# Altium footprint library IC.PcbLib: 34 footprints (part 3 of 3)
Each footprint in its own frame and in the unit in brackets; x right, y up, seen from the top. Pads: shape width x height; smd on the part's side, far side on the other; paste and mask are expansions set on the pad; w line width, h text height; cw(c..) or ccw(c..) is an arc to the next point about the centre after c.
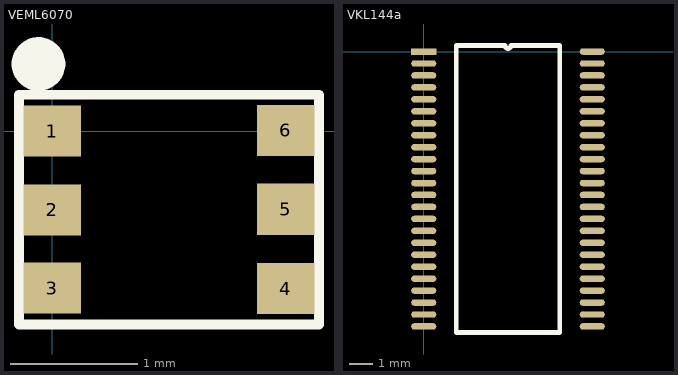
[diagram p2: the footprints below, top view; thin cyan lines are the x and y axes]

## VEML6070 [mm]
pads (6):
  rect 0.45x0.4 smd: 1(0,0) 2(0,-0.617) 3(0,-1.229) 4(1.829,-1.234) 5(1.829,-0.612) 6(1.829,0.005)
Top Overlay:
  circle w0.254: c-0.107,0.526 r0.083
  lines w0.076: -0.26,-1.516 2.09,-1.516 2.09,0.284 -0.26,0.284 -0.26,-1.516
3D body: height 0.25, standoff 0, extent -0.224,-1.506 2.062,0.272

## VKL144a [mm]
pads (48):
  rect 1.05x0.27 smd: 1(0,0)
  oval 1.05x0.27 smd: 2(0,-0.5) 3(0,-1) 4(0,-1.5) 5(0,-2) 6(0,-2.5) 7(0,-3) 8(0,-3.5) 9(0,-4) 10(0,-4.5) 11(0,-5) 12(0,-5.5) 13(0,-6) 14(0,-6.5) 15(0,-7) 16(0,-7.5) 17(0,-8) 18(0,-8.5) 19(0,-9) 20(0,-9.5) 21(0,-10) 22(0,-10.5) 23(0,-11) 24(0,-11.5) 25(7.05,-11.5) 26(7.05,-11) 27(7.05,-10.5) 28(7.05,-10) 29(7.05,-9.5) 30(7.05,-9) 31(7.05,-8.5) 32(7.05,-8) 33(7.05,-7.5) 34(7.05,-7) 35(7.05,-6.5) 36(7.05,-6) 37(7.05,-5.5) 38(7.05,-5) 39(7.05,-4.5) 40(7.05,-4) 41(7.05,-3.5) 42(7.05,-3) 43(7.05,-2.5) 44(7.05,-2) 45(7.05,-1.5) 46(7.05,-1) 47(7.05,-0.5) 48(7.05,0)
Top Overlay:
  lines w0.2: 1.36,-11.75 5.69,-11.75 5.69,0.25 3.65,0.25 cw(c3.525,0.25) 3.4,0.25 1.36,0.25 1.36,-11.75
3D body: height 2, standoff 0, extent 1.27,-11.811 5.715,0.254